# Altium footprint library mastermind.PCBLIB: 1061 footprints (part 29 of 67)
Each footprint in its own frame and in the unit in brackets; x right, y up, seen from the top. Pads: shape width x height; smd on the part's side, far side on the other; paste and mask are expansions set on the pad; w line width, h text height; cw(c..) or ccw(c..) is an arc to the next point about the centre after c.
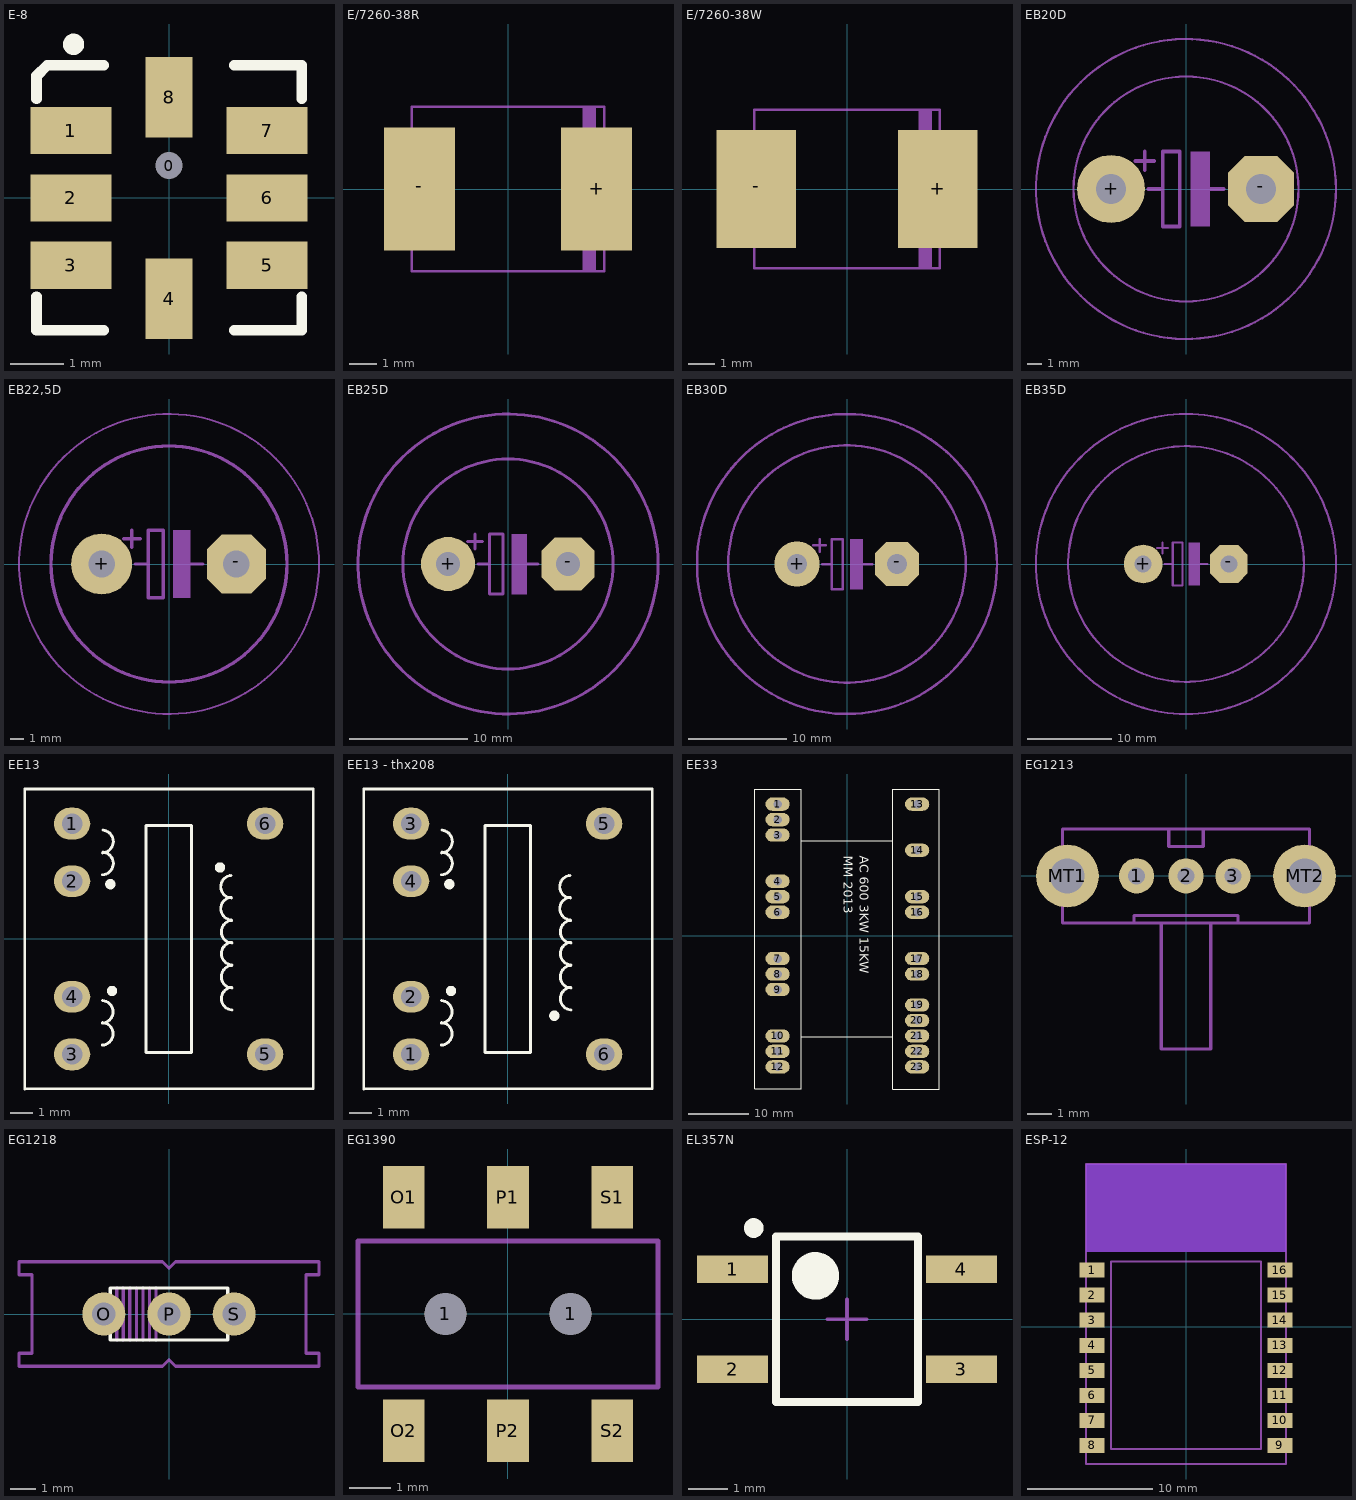
[diagram p28: the footprints below, top view; thin cyan lines are the x and y axes]

## E-8 [mil]
pads (9):
  round 15 hole 20 unplated: 0(-0.02,23.98)
  rect 60x35 smd: 1(-72.85,49.98) 2(-72.85,-0.02) 3(-72.85,-50.02) 5(72.82,-50.02) 6(72.82,-0.02) 7(72.82,49.98)
  rect 35x60 smd: 4(-0.02,-74.82) 8(-0.02,74.79)
Top Overlay:
  circle w7.87: c-70.89,114.16 r3.94
  lines w7.87: -98.44,-73.44 -98.44,-98.44 -48.44,-98.44 ; -98.44,73.56 -98.44,90.69 ; -90.57,98.56 -48.44,98.56 ; 48.56,-98.44 98.56,-98.44 98.56,-73.44 ; 48.56,98.56 98.56,98.56 98.56,73.56
  lines w8: -98.44,90.69 -90.57,98.56
3D body: height 80, standoff 0, extent -95,-95 95,95

## E/7260-38R [mm]
pads (2):
  rect 2.55x4.4 smd: +(3.175,0) -(-3.175,0)
Mechanical 8:
  region: 2.675,-2.975 2.675,2.975 3.15,2.975 3.15,-2.975
  region: 3.5,-2.05 3.5,2.05 3.65,2.05 3.65,-2.05
  region: -3.65,-2.05 -3.65,2.05 -3.5,2.05 -3.5,-2.05
  lines w0.102: -3.45,-2.95 -3.45,2.95 3.45,2.95 3.45,-2.95 -3.45,-2.95

## E/7260-38W [mm]
pads (2):
  rect 2.95x4.4 smd: +(3.375,0) -(-3.375,0)
Mechanical 8:
  region: 2.675,-2.975 2.675,2.975 3.15,2.975 3.15,-2.975
  region: 3.5,-2.05 3.5,2.05 3.65,2.05 3.65,-2.05
  region: -3.65,-2.05 -3.65,2.05 -3.5,2.05 -3.5,-2.05
  lines w0.102: -3.45,-2.95 -3.45,2.95 3.45,2.95 3.45,-2.95 -3.45,-2.95

## EB20D [mil]
pads (2):
  round 181 hole 79: +(-200,0)
  oct 175.25x175.25 hole 79: -(200,0)
Mechanical 2:
  circle w6: c0,0 r400
  circle w6: c0,0 r300
  region: 13,-100 13,100 63,100 63,-100
  lines w10: -135,75 -85,75 ; -110,50 -110,100 ; -100,0 -62,0 ; 25,0 100,0 ; -62,0 -62,100 -17,100 -17,-100 -62,-100 -62,0

## EB22,5D [mil]
pads (2):
  round 181 hole 79: +(-200,0)
  oct 175.25x175.25 hole 79: -(200,0)
Mechanical 2:
  circle w10: c0,0 r350
  circle w6: c0,0 r445
  region: 13,-100 13,100 63,100 63,-100
  lines w10: -135,75 -85,75 ; -110,50 -110,100 ; -100,0 -62,0 ; 25,0 100,0 ; -62,0 -62,100 -17,100 -17,-100 -62,-100 -62,0

## EB25D [mil]
pads (2):
  round 181 hole 79: +(-200,0)
  oct 175.25x175.25 hole 79: -(200,0)
Mechanical 2:
  circle w10: c0,0 r350
  circle w10: c0,0 r500
  region: 13,-100 13,100 63,100 63,-100
  lines w10: -135,75 -85,75 ; -110,50 -110,100 ; -100,0 -62,0 ; 25,0 100,0 ; -62,0 -62,-100 -17,-100 -17,100 -62,100 -62,0

## EB30D [mil]
pads (2):
  round 181 hole 79: +(-200,0)
  oct 175.25x175.25 hole 79: -(200,0)
Mechanical 2:
  circle w10: c0,0 r600
  circle w10: c0,0 r475
  region: 13,-100 13,100 63,100 63,-100
  lines w10: -135,75 -85,75 ; -110,50 -110,100 ; -100,0 -62,0 ; 25,0 100,0 ; -62,0 -62,100 -17,100 -17,-100 -62,-100 -62,0

## EB35D [mil]
pads (2):
  round 181 hole 79: +(-200,0)
  oct 175.25x175.25 hole 79: -(200,0)
Mechanical 2:
  circle w10: c0,0 r550
  circle w10: c0,0 r700
  region: 13,-100 13,100 63,100 63,-100
  lines w10: -135,75 -85,75 ; -110,50 -110,100 ; -100,0 -62,0 ; 55,0 100,0 ; -62,0 -62,-100 -17,-100 -17,100 -62,100 -62,0

## EE13 [mm]
pads (6):
  oval 1.6x1.4 hole 0.9: 1(-4.25,5.08) 2(-4.25,2.54) 3(-4.25,-5.08) 4(-4.25,-2.54) 5(4.25,-5.08) 6(4.25,5.08)
Top Overlay:
  circle w0.254: c-2.565,2.413 r0.1
  circle w0.254: c2.261,3.15 r0.1
  circle w0.254: c-2.489,-2.286 r0.1
  lines w0.127: -2.921,-4.674 ccw(c-2.948,-4.174) -2.908,-3.676 ; -2.921,-3.708 ccw(c-2.948,-3.209) -2.908,-2.711 ; -2.907,2.829 ccw(c-2.934,3.328) -2.894,3.826 ; -2.907,3.794 ccw(c-2.934,4.293) -2.894,4.791 ; 2.755,1.836 ccw(c2.796,1.337) 2.769,0.838 ; 2.755,2.801 ccw(c2.796,2.303) 2.769,1.803 ; 2.781,-2.127 ccw(c2.821,-2.625) 2.794,-3.124 ; 2.781,-1.161 ccw(c2.821,-1.66) 2.794,-2.159 ; 2.781,-0.145 ccw(c2.821,-0.644) 2.794,-1.143 ; 2.781,0.82 ccw(c2.821,0.321) 2.794,-0.178 ; -6.333,-6.604 6.367,-6.579 6.367,6.604 -6.333,6.604 -6.333,-6.604 ; -1,-5 1,-5 1,5 -1,5 -1,-5
3D body "User Library-EE13-T3041.STEP": height 11.88, standoff -4.67, extent -6.05,-6.61 6.35,6.61

## EE13 - thx208 [mm]
pads (6):
  oval 1.6x1.4 hole 0.9: 1(-4.25,-5.08) 2(-4.25,-2.54) 3(-4.25,5.08) 4(-4.25,2.54) 5(4.25,5.08) 6(4.25,-5.08)
Top Overlay:
  circle w0.254: c-2.565,2.413 r0.1
  circle w0.254: c2.057,-3.378 r0.1
  circle w0.254: c-2.489,-2.286 r0.1
  lines w0.127: -2.921,-4.674 ccw(c-2.948,-4.174) -2.908,-3.676 ; -2.921,-3.708 ccw(c-2.948,-3.209) -2.908,-2.711 ; -2.907,2.829 ccw(c-2.934,3.328) -2.894,3.826 ; -2.907,3.794 ccw(c-2.934,4.293) -2.894,4.791 ; 2.755,1.836 ccw(c2.796,1.337) 2.769,0.838 ; 2.755,2.801 ccw(c2.796,2.303) 2.769,1.803 ; 2.781,-2.127 ccw(c2.821,-2.625) 2.794,-3.124 ; 2.781,-1.161 ccw(c2.821,-1.66) 2.794,-2.159 ; 2.781,-0.145 ccw(c2.821,-0.644) 2.794,-1.143 ; 2.781,0.82 ccw(c2.821,0.321) 2.794,-0.178 ; -6.333,-6.604 6.367,-6.579 6.367,6.604 -6.333,6.604 -6.333,-6.604 ; -1,-5 1,-5 1,5 -1,5 -1,-5
3D body "User Library-EE13-T3041.STEP": height 11.88, standoff -4.67, extent -6.05,-6.61 6.35,6.61

## EE33 [mm]
pads (23):
  oval 4x2.2 hole 1.4: 1(-11.5,21.65) 2(-11.5,19.1) 3(-11.5,16.55) 4(-11.5,8.95) 5(-11.5,6.4) 6(-11.5,3.85) 7(-11.5,-3.8) 8(-11.5,-6.35) 9(-11.5,-8.9) 10(-11.5,-16.55) 11(-11.5,-19.1) 12(-11.5,-21.65) 13(11.5,21.65) 14(11.5,14.05) 15(11.5,6.4) 16(11.5,3.85) 17(11.5,-3.8) 18(11.5,-6.35) 19(11.5,-11.45) 20(11.5,-14) 21(11.5,-16.55) 22(11.5,-19.1) 23(11.5,-21.65)
Top Overlay:
  lines w0.127: -7.6,15.6 7.478,15.6 ; -7.594,-16.7 7.484,-16.7 ; -15.3,-25.24 -7.6,-25.24 -7.6,24.14 -15.3,24.14 -15.3,-25.24 ; 7.478,-25.293 15.178,-25.293 15.178,24.087 7.478,24.087 7.478,-25.293
  text "AC 600 3KW 15KW" at 1.529,13.15 h2.6
  text "MM 2013" at -1.071,13.124 h2.6

## EG1213 [mil]
pads (5):
  round 56 hole 27.56: 1(-78.74,0) 2(0,0) 3(74.8,0)
  round 100 hole 55.12: MT1(-188.98,0) MT2(188.98,0)
Mechanical 2:
  lines w5: -82.68,-74.8 -82.68,-62.99 82.68,-62.99 82.68,-74.8 ; -82.68,-74.8 -196.85,-74.8 -196.85,74.8 -27.56,74.8 ; -82.68,-74.8 -39.37,-74.8 ; -39.37,-74.8 -39.37,-275.59 39.37,-275.59 39.37,-74.8 ; -39.37,-74.8 39.37,-74.8 ; -27.56,74.8 -27.56,47.24 27.56,47.24 27.56,74.8 ; -27.56,74.8 27.56,74.8 ; 27.56,74.8 196.85,74.8 196.85,-74.8 82.68,-74.8 ; 39.37,-74.8 82.68,-74.8

## EG1218 [mil]
pads (3):
  round 66 hole 35.43: O(-100,0) P(0,0) S(100,0)
Top Overlay:
  lines w5: -90,-40 -90,40 90,40 90,-40 -90,-40
Mechanical 2:
  lines w5: -80,-40 -80,40 ; -70,-40 -70,40 ; -60,-40 -60,40 ; -50,-40 -50,40 ; -40,-40 -40,40 ; -30,-40 -30,40 ; -20,-40 -20,40 ; -230,-80 -230,-60 -210,-60 -210,60 -230,60 -230,80 -10,80 0,70 10,80 230,80 230,60 210,60 210,-60 230,-60 230,-80 10,-80 0,-70 -10,-80 -230,-80

## EG1390 [mm]
pads (8):
  round 1 hole 1: 1(-1.5,0) 1(1.5,0)
  rect 1x1.5 smd: O1(-2.5,2.8) O2(-2.5,-2.8) P1(0,2.8) P2(0,-2.8) S1(2.5,2.8) S2(2.5,-2.8)
Mechanical 2:
  lines w0.127: -3.6,-1.75 3.6,-1.75 3.6,1.75 -3.6,1.75 -3.6,-1.75

## EL357N [mm]
height 1.75
pads (4):
  rect 1.8x0.7 smd: 1(-2.9,1.27) 2(-2.9,-1.27) 3(2.9,-1.27) 4(2.9,1.27)
Top Overlay:
  circle w0.25: c-2.362,2.311 r0.125
  circle w0.6: c-0.8,1.1 r0.3
  lines w0.2: -1.8,-2.1 -1.8,2.1 1.8,2.1 1.8,-2.1 -1.8,-2.1
Mechanical 15:
  lines w0.1: -0.5,0 0.5,0 ; 0,-0.5 0,0.5
Mechanical 29:
  lines w0.127: -1.8,-2.1 1.8,-2.1 1.8,2.1 -1.8,2.1 -1.8,-2.1
  text ".Comment" at -1.867,-0.483 h1.5
3D body "EL357N.STEP": height 1.75, standoff 0, extent -3.1,-2.324 3.1,2.376

## ESP-12 [mm]
pads (16):
  rect 2x1.2 smd: 1(-7.5,4.5) 2(-7.5,2.5) 3(-7.5,0.5) 4(-7.5,-1.5) 5(-7.5,-3.5) 6(-7.5,-5.5) 7(-7.5,-7.5) 8(-7.5,-9.5) 9(7.5,-9.5) 10(7.5,-7.5) 11(7.5,-5.5) 12(7.5,-3.5) 13(7.5,-1.5) 14(7.5,0.5) 15(7.5,2.5) 16(7.5,4.5)
Top Layer keep-out:
  region: -8,6 -8,13 8,13 8,6
Bottom Layer keep-out:
  region: -8,6 -8,13 8,13 8,6
Mechanical 2:
  lines w0.127: -8,-11 8,-11 8,13 -8,13 -8,-11 ; -6,-9.8 6,-9.8 6,5.2 -6,5.2 -6,-9.8